# Altium footprint library 集大电协1.5.PcbLib: 227 footprints (part 15 of 18)
Each footprint in its own frame and in the unit in brackets; x right, y up, seen from the top. Pads: shape width x height; smd on the part's side, far side on the other; paste and mask are expansions set on the pad; w line width, h text height; cw(c..) or ccw(c..) is an arc to the next point about the centre after c.
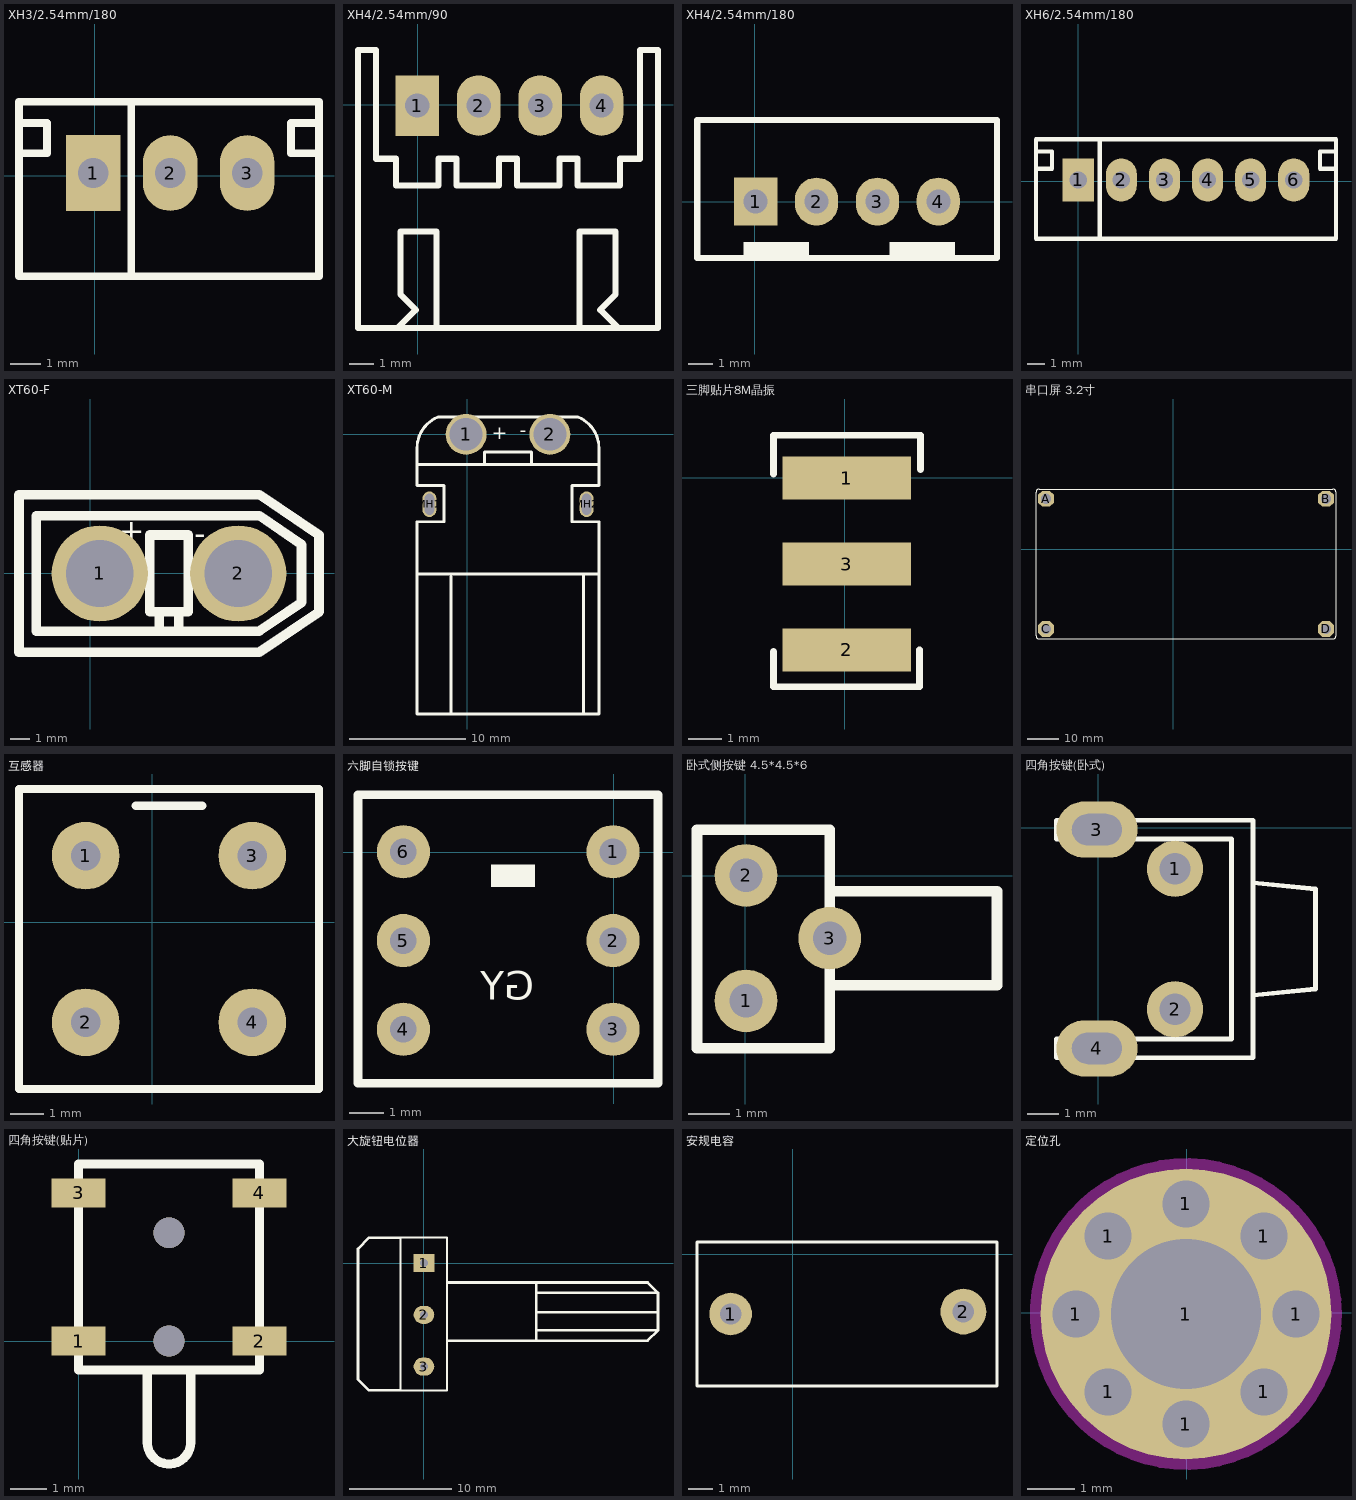
[diagram p14: the footprints below, top view; thin cyan lines are the x and y axes]

## XH3/2.54mm/180 [mm]
pads (3):
  rect 1.8x2.5 hole 1: 1(-0.045,0.08)
  oval 1.8x2.5 hole 1: 2(2.495,0.08) 3(5.035,0.08)
Top Overlay:
  lines w0.254: -2.495,0.73 -1.569,0.73 -1.569,1.73 -2.495,1.73 ; 1.205,-3.32 1.205,2.43 ; 7.405,0.73 6.479,0.73 6.479,1.73 7.405,1.73 ; -2.495,-3.32 7.405,-3.32 7.405,2.43 -2.495,2.43 -2.495,-3.32
3D body "JST-B3B-XH-A.STEP": height 7, standoff -3.4, extent -2.495,-3.32 7.405,2.43

## XH4/2.54mm/90 [mm]
pads (4):
  rect 1.8x2.5 hole 1: 1(-0.015,-0.035)
  oval 1.8x2.5 hole 1: 2(2.525,-0.035) 3(5.065,-0.035) 4(7.605,-0.035)
Top Overlay:
  lines w0.254: -0.805,-9.207 -0.079,-8.481 -0.715,-7.844 -0.715,-5.235 0.785,-5.235 0.785,-9.235 ; 6.685,-9.235 6.685,-5.235 8.185,-5.235 8.185,-7.844 7.548,-8.481 8.275,-9.207 ; -2.465,-9.235 -2.465,2.265 -1.715,2.265 -1.715,-2.235 -0.89,-2.235 -0.89,-3.335 0.86,-3.335 0.86,-2.235 1.61,-2.235 1.61,-3.335 3.36,-3.335 3.36,-2.235 4.11,-2.235 4.11,-3.335 5.86,-3.335 5.86,-2.235 6.61,-2.235 6.61,-3.335 8.36,-3.335 8.36,-2.235 9.185,-2.235 9.185,2.265 9.935,2.265 9.935,-9.235 -2.465,-9.235
3D body "JST-S4B-XH-A.STEP": height 6.1, standoff -3.4, extent -2.465,-9.235 9.935,2.265

## XH4/2.54mm/180 [mm]
pads (4):
  rect 1.8x2 hole 1: 1(0.045,0.005)
  oval 1.8x2 hole 1: 2(2.585,0.005) 3(5.125,0.005) 4(7.665,0.005)
Top Overlay:
  region: 2.273,-1.687 -0.463,-1.687 -0.463,-2.337 2.273,-2.337
  region: 8.369,-1.687 5.633,-1.687 5.633,-2.337 8.369,-2.337
  lines w0.24: 10.115,-2.345 10.115,0.005
  lines w0.254: -2.393,-2.32 -2.393,3.405 ; 10.115,0.005 10.115,3.405 ; -2.405,-2.345 10.115,-2.345 ; -2.405,-2.345 -2.405,3.405 ; -2.405,-2.345 -2.405,0.005 -2.405,3.405 ; -2.405,3.405 10.115,3.405 ; 10.115,-2.345 10.115,-2.345 ; 10.115,-2.345 10.115,3.405
3D body "User Library-B4B-XH-A.STEP": height 7, standoff -3.4, extent -2.345,-2.443 10.055,3.307

## XH6/2.54mm/180 [mm]
pads (6):
  rect 1.8x2.5 hole 1: 1(0.01,0.08)
  oval 1.8x2.5 hole 1: 2(2.51,0.08) 3(5.01,0.08) 4(7.51,0.08) 5(10.01,0.08) 6(12.51,0.08)
Top Overlay:
  lines w0.254: -2.44,0.73 -1.514,0.73 -1.514,1.73 -2.44,1.73 ; 1.26,-3.32 1.26,2.43 ; 14.96,0.73 14.034,0.73 14.034,1.73 14.96,1.73 ; -2.44,-3.32 14.96,-3.32 14.96,2.43 -2.44,2.43 -2.44,-3.32
3D body "JST-B6B-XH-A.STEP": height 7, standoff -3.4, extent -2.44,-3.32 14.96,2.43

## XT60-F [mm]
pads (2):
  round 5 hole 3.5: 1(0.489,0) 2(7.689,0)
Top Overlay:
  lines w0.5: 3.048,-3 -2.819,-3 ; 3.589,-3 3.589,-2 4.589,-2 4.589,-3 ; 5.089,-3 8.791,-3 -2.819,-3 ; 8.791,-3.001 10.982,-1.5 10.982,1.5 8.791,3.001 -2.819,3 -2.819,-3 ; -3.711,-4.1 8.788,-4.1 11.889,-2 11.889,2 8.788,4.1 -3.711,4.1 -3.711,-4.1 ; 3.089,-2 3.089,2 5.089,2 5.089,-2 3.089,-2
  text "+" at 2.819,3.048 h2.03
  text "-" at 5.994,2.794 h2.03
3D body "XT60H male.STEP": height 16.5, standoff -4.7, extent -3.81,-4.064 12.09,4.086

## XT60-M [mm]
pads (4):
  round 3.5 hole 2.8: 1(-0.095,0) 2(7.105,0)
  oval 1.2x2.2 hole 0.8 slot 1.8 at 90 deg: MH1(-3.245,-6) MH2(10.255,-6)
Top Overlay:
  lines w0.254: -4.297,-1.2 cw(c-1.405,-1.179) -2.495,1.5 ; -4.295,-2.6 11.305,-2.6 ; -4.295,-1.2 -4.295,-4.4 -1.995,-4.4 -1.995,-7.5 -4.295,-7.5 -4.295,-12 ; -1.395,-24 -1.395,-12.2 ; 1.505,-2.5 1.505,-1.5 5.505,-1.5 5.505,-2.5 ; 10.005,-24 10.005,-12 ; 11.305,-1.2 11.305,-4.4 9.005,-4.4 9.005,-7.5 11.305,-7.5 11.305,-12 ; 11.308,-1.2 ccw(c8.416,-1.179) 9.505,1.5 ; -4.295,-24 11.305,-24 ; -4.295,-24 -4.295,-12 ; -4.295,-24 11.305,-24 ; -4.295,-12 4.905,-12 11.305,-12 ; -2.495,1.5 9.505,1.5 ; -2.495,1.5 9.505,1.5 ; 11.305,-24 11.305,-12
  text "-" at 4.505,-0.6 h2.03
  text "+" at 2.105,-0.8 h2.03
3D body "User Library-XT60PW 3D DRAWING-1.STEP": height 4.1, standoff -6.4, extent -4.267,-40.304 11.633,1.524

## 三脚贴片8M晶振 [mm] "CSTCC8M00G53-RO"
pads (3):
  rect 3.8x1.27 smd: 1(0.06,-0.006) 2(0.06,-5.086) 3(0.06,-2.546)
Top Overlay:
  lines w0.203: -2.099,-5.137 -2.099,-6.178 2.219,-6.178 2.219,-5.086 ; -2.099,0.121 -2.099,1.264 2.244,1.264 2.244,0.248
3D body: height 1.5, standoff 0.1, extent -1.718,-6.229 1.838,1.264

## 串口屏 3.2寸 [mm]
pads (4):
  oct 5x5 hole 3.2: A(-40.3,15.9) B(48.3,15.9) C(-40.3,-25.3) D(48.3,-25.3)
Top Overlay:
  lines w0.127: -43.5,-27.5 ccw(c-42.5,-27.5) -42.5,-28.5 50.5,-28.5 ccw(c50.5,-27.5) 51.5,-27.5 51.5,18 ccw(c50.5,18) 50.5,19 -42.5,19 ccw(c-42.5,18) -43.5,18 -43.5,-27.5

## 互感器 [mil]
pads (4):
  round 80 hole 35: 1(-78.74,78.74) 2(-78.74,-118.11) 3(118.11,78.74) 4(118.11,-118.11)
Top Overlay:
  lines w10: -19.68,137.8 59.06,137.8 ; -157.48,-196.85 196.85,-196.85 196.85,157.48 -157.48,157.48 -157.48,-196.85

## 六脚自锁按键 [mil]
pads (6):
  round 60 hole 30: 1(-0.63,0.71) 2(-0.63,-99.29) 3(-0.63,-199.29) 4(-236.85,-199.29) 5(-236.85,-99.29) 6(-236.85,0.71)
Top Overlay:
  region: -88.43,-13.66 -138.43,-13.66 -138.43,-38.66 -88.43,-38.66
  lines w10: -288,-260 50,-260 50,65 -288,65 -288,-260
  text "GY" at -89.21,-176.46 h55
3D body "TL 2201.step": height 551.18, standoff -137.8, extent -287.32,-266 47.32,68.64

## 卧式侧按键 4.5*4.5*6 [mm] "卧式侧按键 4.5*4.5*6"
pads (3):
  round 1.5 hole 0.8: 1(0.022,-2.992) 2(0.022,0.008) 3(2.022,-1.492)
Top Overlay:
  lines w0.254: 2.022,-2.617 6.022,-2.617 6.022,-0.367 2.022,-0.367 ; -1.15,-4.125 -1.15,1.1 2.022,1.1 2.022,-4.125 -1.15,-4.125

## 四角按键(卧式) [mm] "轻触开关 卧式带支架"
pads (4):
  round 1.8 hole 1: 1(2.452,-1.308) 2(2.452,-5.808)
  oval 2.6x1.8 hole 1 slot 1.6 at 0 deg: 3(-0.048,-0.058) 4(-0.048,-7.058)
Top Overlay:
  lines w0.16: 1.452,-7.358 4.952,-7.358 ; 4.952,-5.358 6.952,-5.158 6.952,-1.958 4.952,-1.758 ; 4.952,-7.358 4.952,0.242 -1.348,0.242 -1.348,-0.358 4.252,-0.358 4.252,-6.758 -1.348,-6.758 -1.348,-7.358 4.952,-7.358

## 四角按键(贴片) [mm]
pads (4):
  rect 1.5x0.8 smd: 1(0,0) 2(5,0) 3(0,4.1) 4(5,4.1)
via 2.5,0 diameter 0.85 hole 0.85
via 2.5,3 diameter 0.85 hole 0.85
Top Overlay:
  lines w0.254: 1.9,-0.8 1.9,-2.8 ccw(c2.5,-2.8) 3.1,-2.8 3.1,-0.8 ; 0,-0.8 5,-0.8 5,4.9 0,4.9 0,-0.8
3D body: height 2.5, standoff 0, extent -1.079,-1.243 6.121,5.257

## 大旋钮电位器 [mil]
pads (3):
  rect 80x70 hole 30: 1(0,0)
  oval 80x70 hole 30: 2(0,-200) 3(0,-400)
Top Overlay:
  lines w7.87: -90,-492.13 90,-492.13 90,98.43 -90,98.43 -90,-492.13
  lines w10: -90,-492.13 -212.87,-492.13 -255,-450 -255,55 -211.57,98.43 -90,98.43 ; 90,-300 825,-300 ; 90,-75 865,-75 905,-115 ; 435,-300 435,-75 ; 435,-260 905,-260 ; 435,-190 900,-190 ; 435,-115 905,-115 ; 815,-300 865,-300 905,-260 ; 905,-260 905,-115

## 安规电容 [mm]
pads (2):
  round 1.778 hole 0.889: 1(-2.6,-2.5)
  round 1.905 hole 0.889: 2(7.1,-2.4)
Top Overlay:
  lines w0.127: -4,-5.5 8.5,-5.5 8.5,0.5 -4,0.5 -4,-5.5
3D body "Capacitor 10n - 630V.step": height 10.92, standoff -3, extent -4.155,-4.976 8.595,-0.225

## 定位孔 [mm]
pads (9):
  round 1 hole 1: 1(-2.368,-0.023) 1(-1.679,-1.685) 1(-1.679,1.638) 1(-0.018,-2.373) 1(-0.018,2.327) 1(1.644,-1.685) 1(1.644,1.638) 1(2.332,-0.023)
  round 6.2 hole 3.2: 1(-0.018,-0.023)
Keep-Out Layer:
  circle w0.254: c-0.018,-0.023 r3.2